# Altium footprint library cool_library.PcbLib: 1182 footprints (part 31 of 75)
Each footprint in its own frame and in the unit in brackets; x right, y up, seen from the top. Pads: shape width x height; smd on the part's side, far side on the other; paste and mask are expansions set on the pad; w line width, h text height; cw(c..) or ccw(c..) is an arc to the next point about the centre after c.
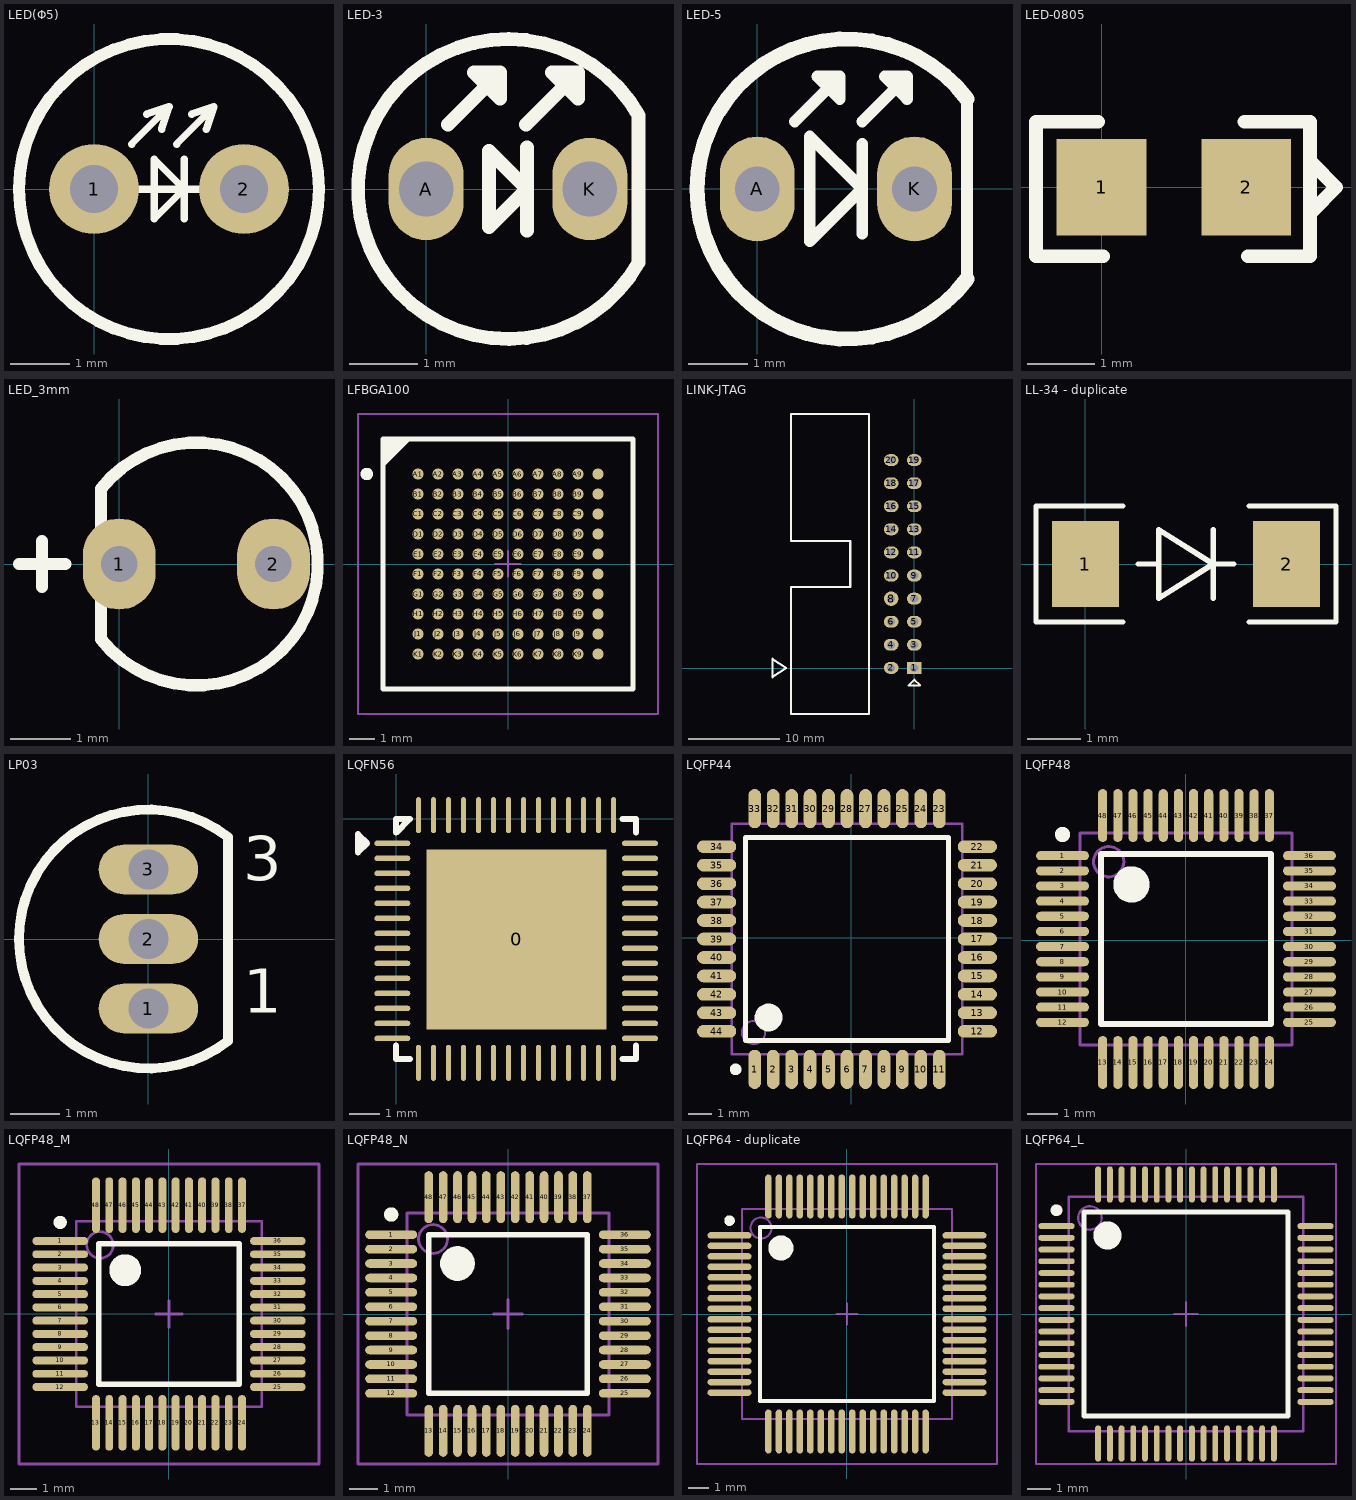
[diagram p30: the footprints below, top view; thin cyan lines are the x and y axes]

## LED(Φ5) [mil]
pads (2):
  round 60 hole 32: 1(0,0) 2(100,0)
Top Overlay:
  circle w8: c50,0 r100
  lines w5: 25,30 50,55 ; 30,0 70,0 ; 35,50 50,55 ; 45,40 50,55 ; 55,30 80,55 ; 60,-20 60,20 ; 65,50 80,55 ; 75,40 80,55 ; 40,-20 60,0 40,20 40,-20

## LED-3 [mm]
pads (2):
  oval 1.1x1.5 hole 0.8: A(0,0) K(2.4,0)
Top Overlay:
  lines w0.203: 0.322,0.946 1.084,1.708 ; 1.465,0.946 2.227,1.708 ; 1.479,-0.61 1.479,0.61 ; 3.116,-1.073 3.116,1.082 ccw(c1.2,0) 3.119,-1.076 ; 1.084,1.708 0.703,1.708 1.084,1.327 1.084,1.708 ; 2.227,1.708 2.227,1.327 1.846,1.708 2.227,1.708 ; 0.921,-0.559 1.479,0 0.921,0.559 0.921,-0.559

## LED-5 [mil]
pads (2):
  oval 50x70 hole 30: A(0,0) K(105,0)
Top Overlay:
  lines w7.78: 25,45 55,75 ; 70,-30 70,30 ; 70,45 100,75 ; 140,-60.15 140,60 ; 55,75 40,75 55,60 55,75 ; 100,75 85,75 100,60 100,75 ; 35,-35 70,0 35,35 35,-35
  lines w10: 140,-60.15 cw(c59.9,-0.07) 140,60

## LED-0805 [mil]
height 42
pads (2):
  rect 52x56 smd: 1(0,0) 2(84,0)
Top Overlay:
  lines w8: -2,38 -38,38 -38,-40 1,-40 ; 83,38 121,38 121,-40 85,-40 ; 122,-14 136,0 122,14
3D body: height 10, standoff 0, extent -7.08,-32 92.06,31.65
3D body: height 4, standoff 0, extent 92.06,-32 105,31.65
3D body: height 4, standoff 0, extent -20,-32 -7.08,31.65

## LED_3mm [mm]
pads (2):
  oval 1.2x1.5 hole 0.6: 1(0,0) 2(2.54,0)
Top Overlay:
  lines w0.2: -1.651,0 -0.889,0 ; -1.27,-0.381 -1.27,0.381 ; -0.3,-1.239 ccw(c1.27,0) -0.3,1.239 -0.3,-1.239

## LFBGA100 [mm] "BGA, 100-Leads, Body 10x10mm, Pitch 0.8mm"
height 1.7
pads (100):
  round 0.45 smd: A1(-3.6,3.6) A2(-2.8,3.6) A3(-2,3.6) A4(-1.2,3.6) A5(-0.4,3.6) A6(0.4,3.6) A7(1.2,3.6) A8(2,3.6) A9(2.8,3.6) A10(3.6,3.6) B1(-3.6,2.8) B2(-2.8,2.8) B3(-2,2.8) B4(-1.2,2.8) B5(-0.4,2.8) B6(0.4,2.8) B7(1.2,2.8) B8(2,2.8) B9(2.8,2.8) B10(3.6,2.8) C1(-3.6,2) C2(-2.8,2) C3(-2,2) C4(-1.2,2) C5(-0.4,2) C6(0.4,2) C7(1.2,2) C8(2,2) C9(2.8,2) C10(3.6,2) D1(-3.6,1.2) D2(-2.8,1.2) D3(-2,1.2) D4(-1.2,1.2) D5(-0.4,1.2) D6(0.4,1.2) D7(1.2,1.2) D8(2,1.2) D9(2.8,1.2) D10(3.6,1.2) E1(-3.6,0.4) E2(-2.8,0.4) E3(-2,0.4) E4(-1.2,0.4) E5(-0.4,0.4) E6(0.4,0.4) E7(1.2,0.4) E8(2,0.4) E9(2.8,0.4) E10(3.6,0.4) F1(-3.6,-0.4) F2(-2.8,-0.4) F3(-2,-0.4) F4(-1.2,-0.4) F5(-0.4,-0.4) F6(0.4,-0.4) F7(1.2,-0.4) F8(2,-0.4) F9(2.8,-0.4) F10(3.6,-0.4) G1(-3.6,-1.2) G2(-2.8,-1.2) G3(-2,-1.2) G4(-1.2,-1.2) G5(-0.4,-1.2) G6(0.4,-1.2) G7(1.2,-1.2) G8(2,-1.2) G9(2.8,-1.2) G10(3.6,-1.2) H1(-3.6,-2) H2(-2.8,-2) H3(-2,-2) H4(-1.2,-2) H5(-0.4,-2) H6(0.4,-2) H7(1.2,-2) H8(2,-2) H9(2.8,-2) H10(3.6,-2) J1(-3.6,-2.8) J2(-2.8,-2.8) J3(-2,-2.8) J4(-1.2,-2.8) J5(-0.4,-2.8) J6(0.4,-2.8) J7(1.2,-2.8) J8(2,-2.8) J9(2.8,-2.8) J10(3.6,-2.8) K1(-3.6,-3.6) K2(-2.8,-3.6) K3(-2,-3.6) K4(-1.2,-3.6) K5(-0.4,-3.6) K6(0.4,-3.6) K7(1.2,-3.6) K8(2,-3.6) K9(2.8,-3.6) K10(3.6,-3.6)
Top Overlay:
  circle w0.25: c-5.65,3.6 r0.125
  region: -4,5 -5,4 -5,5
  lines w0.2: -5,4 -4,5 ; -5,-5 -5,5 5,5 5,-5 -5,-5
Mechanical 13:
  lines w0.1: -5,-5 -5,5 5,5 5,-5 -5,-5
Mechanical 15:
  lines w0.1: -0.5,0 0.5,0 ; 0,-0.5 0,0.5 ; -6,-6 -6,6 6,6 6,-6 -6,-6
3D body: height 1.7, standoff 0, extent -5,-5 5,5

## LINK-JTAG [mm]
pads (20):
  rect 1.6x1.3 hole 0.889: 1(-0.013,0.02)
  oval 1.6x1.3 hole 0.889: 2(-2.553,0.02) 3(-0.013,2.56) 4(-2.553,2.56) 5(-0.013,5.1) 6(-2.553,5.1) 7(-0.013,7.64) 9(-0.013,10.18) 10(-2.553,10.18) 11(-0.013,12.72) 12(-2.553,12.72) 13(-0.013,15.26) 14(-2.553,15.26) 15(-0.013,17.8) 16(-2.553,17.8) 17(-0.013,20.34) 18(-2.553,20.34) 19(-0.013,22.88) 20(-2.553,22.88)
  round 1.6 hole 0.889: 8(-2.553,7.64)
Top Overlay:
  lines w0.2: -7.063,13.99 -7.053,13.98
  lines w0.203: -0.635,-1.905 0.635,-1.905 0,-1.27 -0.635,-1.905
  lines w0.254: -7.083,8.91 -13.583,8.91 -13.583,-5.05 -4.983,-5.05 -4.983,27.95 -13.583,27.95 -13.583,13.99 -7.063,13.99 ; -7.053,8.94 -7.053,13.98 ; -15.613,-1.005 -15.613,1.02 -14.113,0.02 -15.613,-1.005
3D body: height 0.25, standoff 0, extent -0.762,22.121 0.756,23.642
3D body: height 0.25, standoff 0, extent -3.277,22.096 -1.759,23.617
3D body: height 0.25, standoff 0, extent -3.277,19.581 -1.759,21.102
3D body: height 0.25, standoff 0, extent -0.762,19.607 0.756,21.128
3D body: height 0.25, standoff 0, extent -0.762,14.552 0.756,16.073
3D body: height 0.25, standoff 0, extent -3.277,14.527 -1.759,16.048
3D body: height 0.25, standoff 0, extent -3.277,17.041 -1.759,18.562
3D body: height 0.25, standoff 0, extent -0.762,17.067 0.756,18.588
3D body: height 0.25, standoff 0, extent -0.787,6.907 0.731,8.428
3D body: height 0.25, standoff 0, extent -3.302,6.881 -1.784,8.402
3D body: height 0.25, standoff 0, extent -3.302,4.367 -1.784,5.888
3D body: height 0.25, standoff 0, extent -0.787,4.392 0.731,5.913
3D body: height 0.25, standoff 0, extent -0.787,9.447 0.731,10.968
3D body: height 0.25, standoff 0, extent -3.302,9.421 -1.784,10.942
3D body: height 0.25, standoff 0, extent -3.302,11.936 -1.784,13.457
3D body: height 0.25, standoff 0, extent -0.787,11.961 0.731,13.482
3D body: height 0.25, standoff 0, extent -0.787,-0.688 0.731,0.833
3D body: height 0.25, standoff 0, extent -3.302,-0.713 -1.784,0.808
3D body: height 0.25, standoff 0, extent -3.302,1.801 -1.784,3.322
3D body: height 0.25, standoff 0, extent -0.787,1.827 0.731,3.348

## LL-34 - duplicate [mm]
pads (2):
  rect 1.25x1.6 smd: 1(0,0) 2(3.75,0)
Top Overlay:
  lines w0.1: 0.699,-1.079 -0.919,-1.079 -0.919,1.079 0.699,1.079 ; 0.986,0 1.367,0 ; 2.383,-0.635 2.383,0.635 ; 2.764,0 2.383,0 ; 3.048,-1.079 4.669,-1.079 4.669,1.079 3.048,1.079 ; 2.383,0 1.367,0.635 1.367,-0.635 2.383,0

## LP03 [mm] "TO, Flat Index; 3 In-Line, Axial Leads; Body Dia. 4.8mm; Leads 0.56 x 0.41 mm (max)"
height 5.34
pads (3):
  oval 2x1 hole 0.8: 1(0,-1.397) 2(0,0) 3(0,1.397)
Top Overlay:
  lines w0.2: 1.601,-2.049 cw(c0,0) 1.601,2.049 ; 1.6,-1.99 1.6,1.99
  text "1" at 1.905,-1.778 h1.52
  text "3" at 1.905,0.889 h1.52

## LQFN56 [mm]
pads (57):
  rect 6x6 smd: 0(4.013,-4.013)
  oval 1.2x0.18 smd: 1(-0.127,-0.813) 2(-0.127,-1.313) 3(-0.127,-1.813) 4(-0.127,-2.313) 5(-0.127,-2.813) 6(-0.127,-3.313) 7(-0.127,-3.813) 8(-0.127,-4.313) 9(-0.127,-4.813) 10(-0.127,-5.313) 11(-0.127,-5.813) 12(-0.127,-6.313) 13(-0.127,-6.813) 14(-0.127,-7.313) 29(8.128,-7.313) 30(8.128,-6.813) 31(8.128,-6.313) 32(8.128,-5.813) 33(8.128,-5.313) 34(8.128,-4.813) 35(8.128,-4.313) 36(8.128,-3.813) 37(8.128,-3.313) 38(8.128,-2.813) 39(8.128,-2.313) 40(8.128,-1.813) 41(8.128,-1.313) 42(8.128,-0.813)
  oval 0.18x1.2 smd: 15(0.746,-8.128) 16(1.246,-8.128) 17(1.746,-8.128) 18(2.246,-8.128) 19(2.746,-8.128) 20(3.246,-8.128) 21(3.746,-8.128) 22(4.246,-8.128) 23(4.746,-8.128) 24(5.246,-8.128) 25(5.746,-8.128) 26(6.246,-8.128) 27(6.746,-8.128) 28(7.246,-8.128) 43(7.246,0.127) 44(6.746,0.127) 45(6.246,0.127) 46(5.746,0.127) 47(5.246,0.127) 48(4.746,0.127) 49(4.246,0.127) 50(3.746,0.127) 51(3.246,0.127) 52(2.746,0.127) 53(2.246,0.127) 54(1.746,0.127) 55(1.246,0.127) 56(0.746,0.127)
Top Overlay:
  lines w0.203: -1.27,-0.813 -0.965,-0.813 ; 0,-7.544 0,-8.001 0.457,-8.001 ; 7.544,-8.001 8.001,-8.001 8.001,-7.544 ; 7.544,0 8.001,0 8.001,-0.457 ; -0.965,-0.813 -1.27,-0.508 -1.27,-1.118 -0.965,-0.813 ; 0,-0.457 0.457,0 0,0 0,-0.457

## LQFP44 [mm]
pads (44):
  oval 0.55x1.7 smd: 1(-4.191,-5.715) 2(-3.391,-5.715) 3(-2.591,-5.715) 4(-1.791,-5.715) 5(-0.991,-5.715) 6(-0.191,-5.715) 7(0.609,-5.715) 8(1.409,-5.715) 9(2.209,-5.715) 10(3.009,-5.715) 11(3.809,-5.715) 23(3.809,5.585) 24(3.009,5.585) 25(2.209,5.585) 26(1.409,5.585) 27(0.609,5.585) 28(-0.191,5.585) 29(-0.991,5.585) 30(-1.791,5.585) 31(-2.591,5.585) 32(-3.391,5.585) 33(-4.191,5.585)
  oval 1.7x0.55 smd: 12(5.459,-4.065) 13(5.459,-3.265) 14(5.459,-2.465) 15(5.459,-1.665) 16(5.459,-0.865) 17(5.459,-0.065) 18(5.459,0.735) 19(5.459,1.535) 20(5.459,2.335) 21(5.459,3.135) 22(5.459,3.935) 34(-5.841,3.935) 35(-5.841,3.135) 36(-5.841,2.335) 37(-5.841,1.535) 38(-5.841,0.735) 39(-5.841,-0.065) 40(-5.841,-0.865) 41(-5.841,-1.665) 42(-5.841,-2.465) 43(-5.841,-3.265) 44(-5.841,-4.065)
Top Overlay:
  circle w0.6: c-3.591,-3.465 r0.3
  circle w0.25: c-5.016,-5.715 r0.125
  lines w0.2: -4.591,-4.465 -4.591,4.335 4.209,4.335 4.209,-4.465 -4.591,-4.465
Mechanical 13:
  circle w0.1: c-4.241,-4.115 r0.5
  lines w0.1: -5.191,-5.065 -5.191,4.935 4.809,4.935 4.809,-5.065 -5.191,-5.065
3D body: height 1.5, standoff 0.1, extent -5.19,-5.064 4.808,4.934

## LQFP48 [mm]
pads (48):
  oval 1.75x0.3 smd: 1(-4.064,2.794) 2(-4.064,2.294) 3(-4.064,1.794) 4(-4.064,1.294) 5(-4.064,0.794) 6(-4.064,0.294) 7(-4.064,-0.206) 8(-4.064,-0.706) 9(-4.064,-1.206) 10(-4.064,-1.706) 11(-4.064,-2.206) 12(-4.064,-2.706) 25(4.086,-2.706) 26(4.086,-2.206) 27(4.086,-1.706) 28(4.086,-1.206) 29(4.086,-0.706) 30(4.086,-0.206) 31(4.086,0.294) 32(4.086,0.794) 33(4.086,1.294) 34(4.086,1.794) 35(4.086,2.294) 36(4.086,2.794)
  oval 0.3x1.75 smd: 13(-2.739,-4.031) 14(-2.239,-4.031) 15(-1.739,-4.031) 16(-1.239,-4.031) 17(-0.739,-4.031) 18(-0.239,-4.031) 19(0.261,-4.031) 20(0.761,-4.031) 21(1.261,-4.031) 22(1.761,-4.031) 23(2.261,-4.031) 24(2.761,-4.031) 37(2.761,4.119) 38(2.261,4.119) 39(1.761,4.119) 40(1.261,4.119) 41(0.761,4.119) 42(0.261,4.119) 43(-0.239,4.119) 44(-0.739,4.119) 45(-1.239,4.119) 46(-1.739,4.119) 47(-2.239,4.119) 48(-2.739,4.119)
Top Overlay:
  circle w0.6: c-1.789,1.844 r0.3
  circle w0.25: c-4.064,3.494 r0.125
  lines w0.2: -2.789,-2.756 2.811,-2.756 2.811,2.844 -2.789,2.844 -2.789,-2.756
Mechanical 13:
  circle w0.1: c-2.539,2.594 r0.5
  lines w0.1: -3.489,-3.456 3.511,-3.456 3.511,3.544 -3.489,3.544 -3.489,-3.456
3D body: height 1.56, standoff 0, extent -4.5,-4.436 4.5,4.564

## LQFP48_M [mm] "Thin QFP, 48-Leads, Body 7x7mm, Pitch 0.5mm, IPC Low Density"
height 1.6
pads (48):
  oval 2.1x0.3 smd: 1(-4.1,2.75) 2(-4.1,2.25) 3(-4.1,1.75) 4(-4.1,1.25) 5(-4.1,0.75) 6(-4.1,0.25) 7(-4.1,-0.25) 8(-4.1,-0.75) 9(-4.1,-1.25) 10(-4.1,-1.75) 11(-4.1,-2.25) 12(-4.1,-2.75) 25(4.1,-2.75) 26(4.1,-2.25) 27(4.1,-1.75) 28(4.1,-1.25) 29(4.1,-0.75) 30(4.1,-0.25) 31(4.1,0.25) 32(4.1,0.75) 33(4.1,1.25) 34(4.1,1.75) 35(4.1,2.25) 36(4.1,2.75)
  oval 0.3x2.1 smd: 13(-2.75,-4.1) 14(-2.25,-4.1) 15(-1.75,-4.1) 16(-1.25,-4.1) 17(-0.75,-4.1) 18(-0.25,-4.1) 19(0.25,-4.1) 20(0.75,-4.1) 21(1.25,-4.1) 22(1.75,-4.1) 23(2.25,-4.1) 24(2.75,-4.1) 37(2.75,4.1) 38(2.25,4.1) 39(1.75,4.1) 40(1.25,4.1) 41(0.75,4.1) 42(0.25,4.1) 43(-0.25,4.1) 44(-0.75,4.1) 45(-1.25,4.1) 46(-1.75,4.1) 47(-2.25,4.1) 48(-2.75,4.1)
Top Overlay:
  circle w0.6: c-1.65,1.65 r0.3
  circle w0.25: c-4.1,3.45 r0.125
  lines w0.2: -2.65,-2.65 2.65,-2.65 2.65,2.65 -2.65,2.65 -2.65,-2.65
Mechanical 13:
  circle w0.1: c-2.6,2.6 r0.5
  lines w0.1: -3.5,-3.5 3.5,-3.5 3.5,3.5 -3.5,3.5 -3.5,-3.5
Mechanical 15:
  lines w0.1: -0.5,0 0.5,0 ; 0,-0.5 0,0.5 ; -5.65,-5.65 5.65,-5.65 5.65,5.65 -5.65,5.65 -5.65,-5.65
3D body: height 1.6, standoff 0, extent -3.5,-3.5 3.5,3.5

## LQFP48_N [mm] "Thin QFP, 48-Leads, Body 7x7mm, Pitch 0.5mm, IPC Medium Density"
height 1.6
pads (48):
  oval 1.8x0.3 smd: 1(-4.05,2.75) 2(-4.05,2.25) 3(-4.05,1.75) 4(-4.05,1.25) 5(-4.05,0.75) 6(-4.05,0.25) 7(-4.05,-0.25) 8(-4.05,-0.75) 9(-4.05,-1.25) 10(-4.05,-1.75) 11(-4.05,-2.25) 12(-4.05,-2.75) 25(4.05,-2.75) 26(4.05,-2.25) 27(4.05,-1.75) 28(4.05,-1.25) 29(4.05,-0.75) 30(4.05,-0.25) 31(4.05,0.25) 32(4.05,0.75) 33(4.05,1.25) 34(4.05,1.75) 35(4.05,2.25) 36(4.05,2.75)
  oval 0.3x1.8 smd: 13(-2.75,-4.05) 14(-2.25,-4.05) 15(-1.75,-4.05) 16(-1.25,-4.05) 17(-0.75,-4.05) 18(-0.25,-4.05) 19(0.25,-4.05) 20(0.75,-4.05) 21(1.25,-4.05) 22(1.75,-4.05) 23(2.25,-4.05) 24(2.75,-4.05) 37(2.75,4.05) 38(2.25,4.05) 39(1.75,4.05) 40(1.25,4.05) 41(0.75,4.05) 42(0.25,4.05) 43(-0.25,4.05) 44(-0.75,4.05) 45(-1.25,4.05) 46(-1.75,4.05) 47(-2.25,4.05) 48(-2.75,4.05)
Top Overlay:
  circle w0.25: c-4.05,3.45 r0.125
  circle w0.6: c-1.75,1.75 r0.3
  lines w0.2: -2.75,-2.75 -2.75,2.75 2.75,2.75 2.75,-2.75 -2.75,-2.75
Mechanical 13:
  circle w0.1: c-2.6,2.6 r0.5
  lines w0.1: -3.5,-3.5 -3.5,3.5 3.5,3.5 3.5,-3.5 -3.5,-3.5
Mechanical 15:
  lines w0.1: -0.5,0 0.5,0 ; 0,-0.5 0,0.5 ; -5.2,-5.2 -5.2,5.2 5.2,5.2 5.2,-5.2 -5.2,-5.2
3D body: height 1.6, standoff 0, extent -3.5,-3.5 3.5,3.5

## LQFP64 - duplicate [mm] "中等容量RBT6"
pads (64):
  oval 2.1x0.3 smd: 1(-5.6,3.75) 2(-5.6,3.25) 3(-5.6,2.75) 4(-5.6,2.25) 5(-5.6,1.75) 6(-5.6,1.25) 7(-5.6,0.75) 8(-5.6,0.25) 9(-5.6,-0.25) 10(-5.6,-0.75) 11(-5.6,-1.25) 12(-5.6,-1.75) 13(-5.6,-2.25) 14(-5.6,-2.75) 15(-5.6,-3.25) 16(-5.6,-3.75) 33(5.6,-3.75) 34(5.6,-3.25) 35(5.6,-2.75) 36(5.6,-2.25) 37(5.6,-1.75) 38(5.6,-1.25) 39(5.6,-0.75) 40(5.6,-0.25) 41(5.6,0.25) 42(5.6,0.75) 43(5.6,1.25) 44(5.6,1.75) 45(5.6,2.25) 46(5.6,2.75) 47(5.6,3.25) 48(5.6,3.75)
  oval 0.3x2.1 smd: 17(-3.75,-5.6) 18(-3.25,-5.6) 19(-2.75,-5.6) 20(-2.25,-5.6) 21(-1.75,-5.6) 22(-1.25,-5.6) 23(-0.75,-5.6) 24(-0.25,-5.6) 25(0.25,-5.6) 26(0.75,-5.6) 27(1.25,-5.6) 28(1.75,-5.6) 29(2.25,-5.6) 30(2.75,-5.6) 31(3.25,-5.6) 32(3.75,-5.6) 49(3.75,5.6) 50(3.25,5.6) 51(2.75,5.6) 52(2.25,5.6) 53(1.75,5.6) 54(1.25,5.6) 55(0.75,5.6) 56(0.25,5.6) 57(-0.25,5.6) 58(-0.75,5.6) 59(-1.25,5.6) 60(-1.75,5.6) 61(-2.25,5.6) 62(-2.75,5.6) 63(-3.25,5.6) 64(-3.75,5.6)
Top Overlay:
  circle w0.6: c-3.15,3.15 r0.3
  circle w0.25: c-5.6,4.45 r0.125
  lines w0.2: -4.15,-4.15 4.15,-4.15 4.15,4.15 -4.15,4.15 -4.15,-4.15
Mechanical 13:
  circle w0.1: c-4.1,4.1 r0.5
  lines w0.1: -5,-5 5,-5 5,5 -5,5 -5,-5
Mechanical 15:
  lines w0.1: -0.5,0 0.5,0 ; 0,-0.5 0,0.5 ; -7.15,-7.15 7.15,-7.15 7.15,7.15 -7.15,7.15 -7.15,-7.15
3D body: height 1.6, standoff 0, extent -6,-6 6,6

## LQFP64_L [mm] "Thin QFP, 64-Leads, Body 10x10mm, Pitch 0.5mm, IPC High Density"
height 1.6
pads (64):
  oval 1.55x0.25 smd: 1(-5.525,3.75) 2(-5.525,3.25) 3(-5.525,2.75) 4(-5.525,2.25) 5(-5.525,1.75) 6(-5.525,1.25) 7(-5.525,0.75) 8(-5.525,0.25) 9(-5.525,-0.25) 10(-5.525,-0.75) 11(-5.525,-1.25) 12(-5.525,-1.75) 13(-5.525,-2.25) 14(-5.525,-2.75) 15(-5.525,-3.25) 16(-5.525,-3.75) 33(5.525,-3.75) 34(5.525,-3.25) 35(5.525,-2.75) 36(5.525,-2.25) 37(5.525,-1.75) 38(5.525,-1.25) 39(5.525,-0.75) 40(5.525,-0.25) 41(5.525,0.25) 42(5.525,0.75) 43(5.525,1.25) 44(5.525,1.75) 45(5.525,2.25) 46(5.525,2.75) 47(5.525,3.25) 48(5.525,3.75)
  oval 0.25x1.55 smd: 17(-3.75,-5.525) 18(-3.25,-5.525) 19(-2.75,-5.525) 20(-2.25,-5.525) 21(-1.75,-5.525) 22(-1.25,-5.525) 23(-0.75,-5.525) 24(-0.25,-5.525) 25(0.25,-5.525) 26(0.75,-5.525) 27(1.25,-5.525) 28(1.75,-5.525) 29(2.25,-5.525) 30(2.75,-5.525) 31(3.25,-5.525) 32(3.75,-5.525) 49(3.75,5.525) 50(3.25,5.525) 51(2.75,5.525) 52(2.25,5.525) 53(1.75,5.525) 54(1.25,5.525) 55(0.75,5.525) 56(0.25,5.525) 57(-0.25,5.525) 58(-0.75,5.525) 59(-1.25,5.525) 60(-1.75,5.525) 61(-2.25,5.525) 62(-2.75,5.525) 63(-3.25,5.525) 64(-3.75,5.525)
Top Overlay:
  circle w0.25: c-5.525,4.425 r0.125
  circle w0.6: c-3.35,3.35 r0.3
  lines w0.2: -4.35,-4.35 -4.35,4.35 4.35,4.35 4.35,-4.35 -4.35,-4.35
Mechanical 13:
  circle w0.1: c-4.1,4.1 r0.5
  lines w0.1: -5,-5 -5,5 5,5 5,-5 -5,-5
Mechanical 15:
  lines w0.1: -0.5,0 0.5,0 ; 0,-0.5 0,0.5 ; -6.4,-6.4 -6.4,6.4 6.4,6.4 6.4,-6.4 -6.4,-6.4
3D body: height 1.6, standoff 0, extent -5,-5 5,5